# Altium footprint library 常用元件封装库.PcbLib: 1310 footprints (part 59 of 83)
Each footprint in its own frame and in the unit in brackets; x right, y up, seen from the top. Pads: shape width x height; smd on the part's side, far side on the other; paste and mask are expansions set on the pad; w line width, h text height; cw(c..) or ccw(c..) is an arc to the next point about the centre after c.
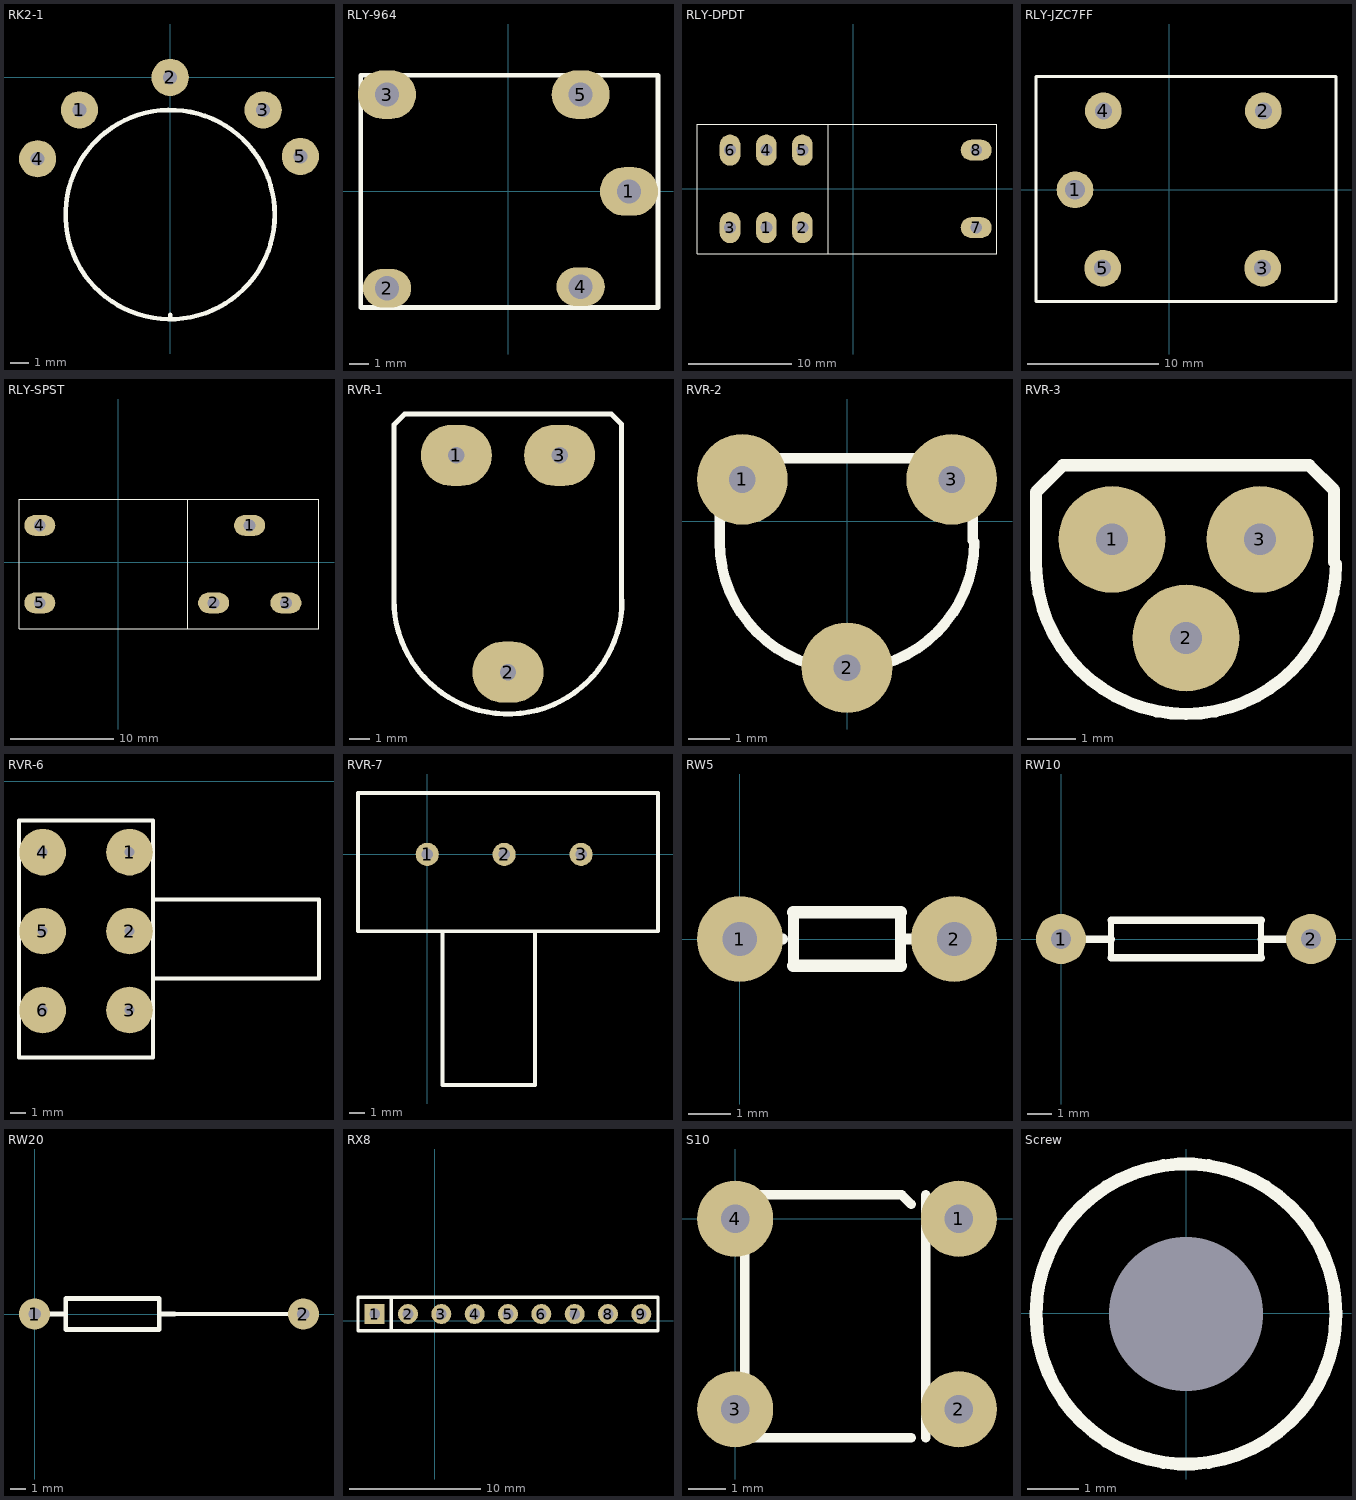
[diagram p58: the footprints below, top view; thin cyan lines are the x and y axes]

## RK2-1 [mil]
pads (5):
  round 80 hole 30: 1(-195,-70) 2(0,0) 3(200,-70) 4(-285,-175) 5(280,-170)
Top Overlay:
  circle w10: c0,-295 r225
  lines w10: 0,-515 0,-510

## RLY-964 [mil]
pads (5):
  oval 120x100 hole 50: 1(250,0) 3(-250,200) 5(150,200)
  oval 100x80 hole 50: 2(-250,-200) 4(150,-196.85)
Top Overlay:
  lines w10: -304.17,-240 310,-240 310,0 310,240 -304.17,240 -304.17,-240

## RLY-DPDT [mil]
pads (8):
  oval 79x118 hole 45: 1(-330.5,-147.5) 2(-193.5,-147.5) 3(-468.5,-147.5) 4(-330.5,147.5) 5(-193.5,147.5) 6(-468.5,147.5)
  oval 118x79 hole 45: 7(468.5,-147.5) 8(468.5,147.5)
Top Overlay:
  lines w4: -94.5,-246.5 -94.5,245.5 ; -594.5,-246.5 547.5,-246.5 547.5,245.5 -594.5,245.5 -594.5,-246.5

## RLY-JZC7FF [mm]
pads (5):
  round 2.8 hole 1.5: 1(-7.175,-0.025)
  round 2.8 hole 1.3: 2(7.175,5.994) 3(7.125,-5.994) 4(-5.016,5.994) 5(-5.067,-5.994)
Top Overlay:
  lines w0.254: -10.147,-8.534 -10.147,8.611 12.713,8.611 12.713,-8.534 -10.147,-8.534

## RLY-SPST [mil]
pads (5):
  oval 118x79 hole 45: 1(500,140) 2(363,-155) 3(638,-155) 4(-299,140) 5(-299,-155)
Top Overlay:
  lines w4: 264,-253 264,239 ; -378,-253 -378,239 764,239 764,-253 -378,-253

## RVR-1 [mm]
pads (3):
  oval 3.5x3 hole 0.8: 1(10.16,-4.572) 2(12.7,-15.24) 3(15.24,-4.572)
Top Overlay:
  lines w0.254: 18.288,-12.192 18.288,-3.048 17.78,-2.54 7.62,-2.54 7.089,-3.071 7.089,-11.684 ccw(c12.7,-11.684) 18.311,-11.684

## RVR-2 [mm]
pads (3):
  round 2.2 hole 0.65: 1(-2.54,1.016) 2(0,-3.556) 3(2.54,1.016)
Top Overlay:
  lines w0.254: 3.048,-0.466 3.048,1.016 2.54,1.524 -2.54,1.524 -3.09,0.974 -3.09,-0.508 ccw(c0,-0.508) 3.09,-0.508

## RVR-3 [mm]
pads (3):
  round 2.2 hole 0.65: 1(3.556,-4.064) 2(5.08,-6.096) 3(6.604,-4.064)
Top Overlay:
  lines w0.254: 8.128,-4.53 8.128,-3.048 7.62,-2.54 2.54,-2.54 1.99,-3.09 1.99,-4.572 ccw(c5.08,-4.572) 8.17,-4.572

## RVR-6 [mm]
pads (6):
  round 3 hole 0.65: 1(11.176,-4.572) 2(11.176,-9.652) 3(11.176,-14.732) 4(5.588,-4.572) 5(5.588,-9.652) 6(5.588,-14.732)
Top Overlay:
  lines w0.254: 12.7,-12.7 23.368,-12.7 23.368,-7.62 12.7,-7.62 ; 4.064,-17.78 12.7,-17.78 12.7,-2.54 4.064,-2.54 4.064,-17.78

## RVR-7 [mil]
pads (3):
  round 60 hole 30: 1(0,0) 2(200,0) 3(400,0)
Top Overlay:
  lines w10: -160,160 600,160 600,-200 -160,-200 -180,-200 -180,160 -120,160 ; 40,-200 40,-600 280,-600 280,-200

## RW5 [mil]
pads (2):
  round 80 hole 32: 1(0,0) 2(200,0)
Top Overlay:
  lines w10: 0,0 40,0 ; 50,-25 50,25 ; 150,-25 150,25 ; 155,0 200,0
  lines w12: 50,-25 150,-25 ; 50,25 150,25

## RW10 [mil]
pads (2):
  round 80 hole 32: 1(0,0) 2(400,0)
Top Overlay:
  lines w10: 80,-30 80,30 ; 320,-30 320,30
  lines w12: 40,0 80,0 ; 80,-30 320,-30 ; 80,30 320,30 ; 320,0 360,0

## RW20 [mil]
pads (2):
  round 80 hole 32: 1(0,0) 2(690,0)
Top Overlay:
  lines w10: 360,0 690,0
  lines w12: 40,0 80,0 ; 320,0 360,0 ; 80,-40 80,40 320,40 320,-40 80,-40

## RX8 [mil]
pads (9):
  rect 60x60 hole 32: 1(-180,20)
  round 60 hole 32: 2(-80,20) 3(20,20) 4(120,20) 5(220,20) 6(320,20) 7(420,20) 8(520,20) 9(620,20)
Top Overlay:
  lines w10: -130,-30 -130,70 ; -230,-30 -230,70 670,70 670,-30 -230,-30

## S10 [mil]
pads (4):
  round 80 hole 30: 1(235,0) 2(235,-200) 3(0,-200) 4(0,0)
Top Overlay:
  lines w10: 185,-230 10,-230 10,25 175,25 185,15 ; 200,-230 200,25

## Screw [mm]
pads (1):
  round 2 hole 3 unplated: ""(-0.009,-0.013)
Top Overlay:
  circle w0.254: c-0.009,-0.013 r2.93